# Altium footprint library Master.PcbLib: 28 footprints (part 1 of 2)
Each footprint in its own frame and in the unit in brackets; x right, y up, seen from the top. Pads: shape width x height; smd on the part's side, far side on the other; paste and mask are expansions set on the pad; w line width, h text height; cw(c..) or ccw(c..) is an arc to the next point about the centre after c.
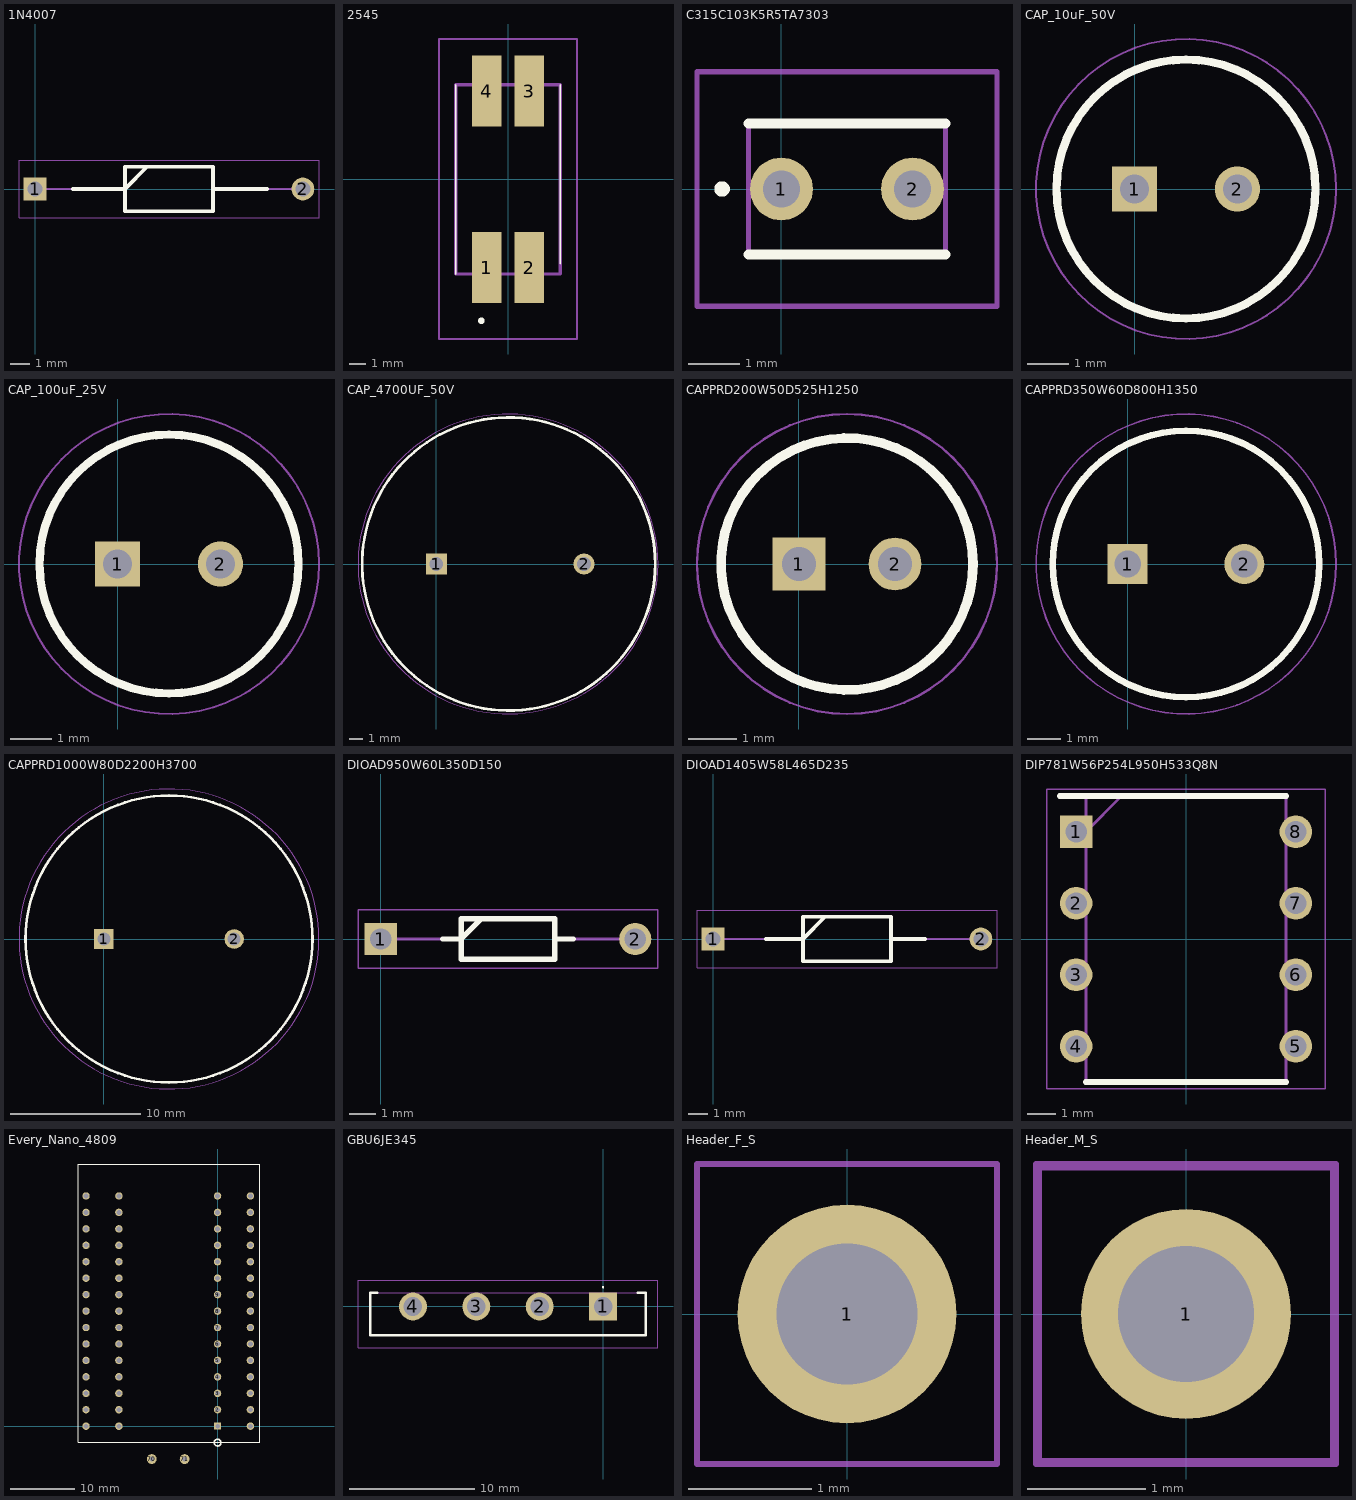
[diagram p0: the footprints below, top view; thin cyan lines are the x and y axes]

## 1N4007 [mm] "Rectifiers Diode, DO-41, 1000V, 1A"
pads (2):
  rect 1.2x1.2 hole 0.8: 1(0,0)
  round 1.2 hole 0.8: 2(14.1,0)
Top Overlay:
  lines w0.2: 1.981,0 4.725,0 5.9,1.175 ; 9.375,0 12.217,0 ; 4.725,-1.175 4.725,1.175 9.375,1.175 9.375,-1.175 4.725,-1.175
Mechanical 13:
  lines w0.1: 0,0 4.725,0 5.9,1.175 ; 9.375,0 14.1,0 ; 4.725,-1.175 4.725,1.175 9.375,1.175 9.375,-1.175 4.725,-1.175
Mechanical 15:
  lines w0.05: -0.85,-1.525 -0.85,1.525 14.95,1.525 14.95,-1.525 -0.85,-1.525
3D body "1N4007.stp": height 2.7, standoff -2.7, extent -0.29,-1.34 14.34,1.34

## 2545 [mm]
pads (4):
  rect 1.78x4.27 smd: 1(-1.27,-5.305) 2(1.27,-5.305) 3(1.27,5.305) 4(-1.27,5.305)
Top Overlay:
  lines w0.1: -3.15,-5.69 -3.15,5.69 ; 3.15,-5.08 3.15,5.69
  lines w0.2: -1.7,-8.5 cw(c-1.6,-8.5) -1.5,-8.5 cw(c-1.6,-8.5) -1.7,-8.5
Mechanical 13:
  lines w0.2: -3.15,-5.69 3.15,-5.69 3.15,5.69 -3.15,5.69 -3.15,-5.69
Mechanical 15:
  lines w0.1: -4.15,-9.6 4.15,-9.6 4.15,8.44 -4.15,8.44 -4.15,-9.6
3D body "CM2545X171R-10.stp": height 9.6, standoff 0, extent -3.15,-7.262 3.15,7.262

## C315C103K5R5TA7303 [mm]
pads (2):
  round 1.217 hole 0.71: 1(0,0) 2(2.54,0)
Top Overlay:
  lines w0.2: -1.2,0 ccw(c-1.15,0) -1.1,0 ; -1.2,0 cw(c-1.15,0) -1.1,0 ; -1.2,0 ccw(c-1.15,0) -1.1,0 ; -0.635,-1.27 3.175,-1.27 -0.635,-1.27 ; -0.635,1.27 3.175,1.27 -0.635,1.27
Mechanical 15:
  lines w0.1: -0.635,-1.27 3.175,-1.27 3.175,1.27 -0.635,1.27 -0.635,-1.27
Mechanical 20:
  lines w0.1: -1.635,-2.27 4.175,-2.27 4.175,2.27 -1.635,2.27 -1.635,-2.27
3D body "C315C103K5R5TA7303.stp": height 3.5, standoff -18, extent -0.64,-1.275 3.17,1.27

## CAP_10uF_50V [mm]
pads (2):
  rect 1.1x1.1 hole 0.7: 1(0,0)
  round 1.1 hole 0.7: 2(2.5,0)
Top Overlay:
  circle w0.2: c1.25,0 r3.15
Mechanical 13:
  circle w0.1: c1.25,0 r3.15
Mechanical 15:
  circle w0.05: c1.25,0 r3.65
3D body "860040473003.stp": height 12.5, standoff -10, extent -2.138,-3.397 4.65,3.397

## CAP_100uF_25V [mm]
pads (2):
  rect 1.1x1.1 hole 0.7: 1(0,0)
  round 1.1 hole 0.7: 2(2.5,0)
Top Overlay:
  circle w0.2: c1.25,0 r3.15
Mechanical 13:
  circle w0.1: c1.25,0 r3.15
Mechanical 15:
  circle w0.05: c1.25,0 r3.65
3D body "860040473003.stp": height 12.5, standoff -10, extent -2.138,-3.397 4.65,3.397

## CAP_4700UF_50V [mil]
pads (2):
  rect 62x62 hole 40: 1(0,0)
  round 62 hole 40: 2(433,0)
Top Overlay:
  circle w7.87: c212,0 r430
Mechanical 13:
  circle w3.94: c212,0 r430
Mechanical 15:
  circle w1.97: c210,0 r440
3D body "CAP_4700_50V.step": height 1653.54, standoff -968.39, extent -225.04,-437.4 648.97,437.4

## CAPPRD200W50D525H1250 [mm]
pads (2):
  rect 1.1x1.1 / inner round 1.1 / far side rect 1.1x1.1 hole 0.7: 1(0,0)
  round 1.1 hole 0.7: 2(2,0)
Top Overlay:
  circle w0.2: c1,0 r2.625
Mechanical 15:
  circle w0.1: c1,0 r2.625
Mechanical 20:
  circle w0.05: c1,0 r3.125
3D body "UKL1H100KDDANA.stp": height 12.5, standoff -10, extent -1.738,-2.747 3.75,2.747

## CAPPRD350W60D800H1350 [mm]
pads (2):
  rect 1.2x1.2 / inner round 1.2 / far side rect 1.2x1.2 hole 0.8: 1(0,0)
  round 1.2 hole 0.8: 2(3.5,0)
Top Overlay:
  circle w0.2: c1.75,0 r4
Mechanical 15:
  circle w0.1: c1.75,0 r4
Mechanical 20:
  circle w0.05: c1.75,0 r4.5
3D body "ESL107M050AGMAA.stp": height 14, standoff -19.5, extent -2.5,-4.25 6,4.25

## CAPPRD1000W80D2200H3700 [mm]
pads (2):
  rect 1.5x1.5 / inner round 1.5 / far side rect 1.5x1.5 hole 1: 1(0,0)
  round 1.5 hole 1: 2(10,0)
Top Overlay:
  circle w0.2: c5,0 r11
Mechanical 15:
  circle w0.1: c5,0 r11
Mechanical 20:
  circle w0.05: c5,0 r11.5
3D body "ESK478M050AQ3AA.stp": height 5.8, standoff -4.65, extent -10,-3.376 10,3.376

## DIOAD950W60L350D150 [mm]
pads (2):
  rect 1.2x1.2 hole 0.8: 1(0,0)
  round 1.2 hole 0.8: 2(9.5,0)
Top Overlay:
  lines w0.2: 2.311,0 3,0 3.75,0.75 ; 6.5,0 7.188,0 ; 3,-0.75 3,0.75 6.5,0.75 6.5,-0.75 3,-0.75
Mechanical 13:
  lines w0.1: 0,0 3,0 3.75,0.75 ; 6.5,0 9.5,0 ; 3,-0.75 3,0.75 6.5,0.75 6.5,-0.75 3,-0.75
Mechanical 15:
  lines w0.05: -0.85,-1.1 -0.85,1.1 10.35,1.1 10.35,-1.1 -0.85,-1.1
3D body "TZX5V1B-TR.stp": height 1.7, standoff -1.7, extent -0.3,-0.844 9.8,0.844

## DIOAD1405W58L465D235 [mm]
pads (2):
  rect 1.2x1.2 / inner round 1.2 / far side rect 1.2x1.2 hole 0.8: 1(0,0)
  round 1.2 hole 0.8: 2(14.1,0)
Top Overlay:
  lines w0.2: 2.769,0 4.725,0 5.9,1.175 ; 9.375,0 11.151,0 ; 4.725,-1.175 4.725,1.175 9.375,1.175 9.375,-1.175 4.725,-1.175
Mechanical 15:
  lines w0.1: 0,0 4.725,0 5.9,1.175 ; 9.375,0 14.1,0 ; 4.725,-1.175 4.725,1.175 9.375,1.175 9.375,-1.175 4.725,-1.175
Mechanical 20:
  lines w0.05: -0.85,-1.525 -0.85,1.525 14.95,1.525 14.95,-1.525 -0.85,-1.525
3D body "1N4007.stp": height 2.7, standoff -2.7, extent -0.29,-1.34 14.34,1.34

## DIP781W56P254L950H533Q8N [mm]
pads (8):
  rect 1.158x1.158 hole 0.758: 1(-3.905,3.81)
  round 1.158 hole 0.758: 2(-3.905,1.27) 3(-3.905,-1.27) 4(-3.905,-3.81) 5(3.905,-3.81) 6(3.905,-1.27) 7(3.905,1.27) 8(3.905,3.81)
Top Overlay:
  lines w0.2: -4.484,5.08 3.556,5.08 ; -3.556,-5.08 3.556,-5.08
Mechanical 13:
  lines w0.1: -3.556,3.81 -2.286,5.08 ; -3.556,-5.08 3.556,-5.08 3.556,5.08 -3.556,5.08 -3.556,-5.08
Mechanical 15:
  lines w0.05: -4.956,-5.33 4.956,-5.33 4.956,5.33 -4.956,5.33 -4.956,-5.33
3D body "MCP6002-E_P.stp": height 5.33, standoff -3.5, extent -4.045,-4.75 4.045,4.75

## Every_Nano_4809 [mm] "Microcontroller"
height 17
pads (62):
  rect 1.1x1.1 / inner round 1.1 / far side rect 1.1x1.1 hole 0.7: 1(0,0)
  round 1.15 hole 0.75: 2(0,2.54) 3(0,5.08) 4(0,7.62) 5(0,10.16) 6(0,12.7) 7(0,15.24) 8(0,17.78) 9(0,20.32) 10(0,22.86) 11(0,25.4) 12(0,27.94) 13(0,30.48) 14(0,33.02) 15(0,35.56) 16(-15.24,35.56) 17(-15.24,33.02) 18(-15.24,30.48) 19(-15.24,27.94) 20(-15.24,25.4) 21(-15.24,22.86) 22(-15.24,20.32) 23(-15.24,17.78) 24(-15.24,15.24) 25(-15.24,12.7) 26(-15.24,10.16) 27(-15.24,7.62) 28(-15.24,5.08) 29(-15.24,2.54) 30(-15.24,0) 31(-20.32,0) 32(-20.32,2.54) 33(-20.32,5.08) 34(-20.32,7.62) 35(-20.32,10.16) 36(-20.32,12.7) 37(-20.32,15.24) 38(-20.32,17.78) 39(-20.32,20.32) 40(-20.32,22.86) 41(-20.32,25.4) 42(-20.32,27.94) 43(-20.32,30.48) 44(-20.32,33.02) 45(-20.32,35.56) 46(5.08,0) 47(5.08,2.54) 48(5.08,5.08) 49(5.08,7.62) 50(5.08,10.16) 51(5.08,12.7) 52(5.08,15.24) 53(5.08,17.78) 54(5.08,20.32) 55(5.08,22.86) 56(5.08,25.4) 57(5.08,27.94) 58(5.08,30.48) 59(5.08,33.02) 60(5.08,35.56)
  round 1.524 hole 0.762: 70(-10.16,-5.08) 71(-5.08,-5.08)
Top Overlay:
  circle w0.254: c0,-2.54 r0.524
  lines w0.08: -21.5,-2.5 -21.5,40.5 6.5,40.5 6.5,-2.5 -21.5,-2.5
3D body "EveryNano v1 v6.step": height 12, standoff -5, extent -21.557,-2.5 6.383,40.615

## GBU6JE345 [mm]
pads (4):
  rect 2.235x2.235 hole 1.49: 1(0,0)
  round 2.235 hole 1.49: 2(-5.08,0) 3(-10.16,0) 4(-15.24,0)
Top Overlay:
  lines w0.1: 0,1.5 cw(c0,1.55) 0,1.6 cw(c0,1.55) 0,1.5
  lines w0.2: -18.085,1.108 -18.645,1.108 -18.645,-2.322 3.405,-2.322 3.405,1.108 2.769,1.108
Mechanical 15:
  lines w0.1: -18.645,-2.322 3.405,-2.322 3.405,1.108 -18.645,1.108 -18.645,-2.322
Mechanical 20:
  lines w0.1: -19.645,-3.322 4.405,-3.322 4.405,2.117 -19.645,2.117 -19.645,-3.322
3D body "GBU6J-E3_45.stp": height 18.9, standoff -5, extent -18.645,-2.322 3.405,1.108

## Header_F_S [mil] "Header female single"
pads (1):
  round 70 hole 45.28: 1(0,0)
Mechanical 15:
  lines w2: -48,-48 48,-48 48,48 -48,48 -48,-48
Mechanical 20:
  lines w1.97: 48,-48 -48,-48 -48,48 48,48
  lines w2: 48,-48 48,48
3D body "HeaderFemale_S.step": height 334.65, standoff -159.45, extent -48.06,-46.06 48,50

## Header_M_S [mil] "Header male single"
pads (1):
  round 70 hole 45.28: 1(0,0)
Mechanical 15:
  lines w2: -49,49 -49,-49 49,-49 49,49 ; -48.94,48.85 49.06,48.85
Mechanical 20:
  lines w1.97: -50,-50 -50,50 50,50 50,-50 -50,-50
3D body "HeaderMale_S.step": height 109.06, standoff -137.95, extent -50,-16.89 50,393.71